# Altium footprint library OXI_ONE.PcbLib: 74 footprints (part 2 of 5)
Each footprint in its own frame and in the unit in brackets; x right, y up, seen from the top. Pads: shape width x height; smd on the part's side, far side on the other; paste and mask are expansions set on the pad; w line width, h text height; cw(c..) or ccw(c..) is an arc to the next point about the centre after c.
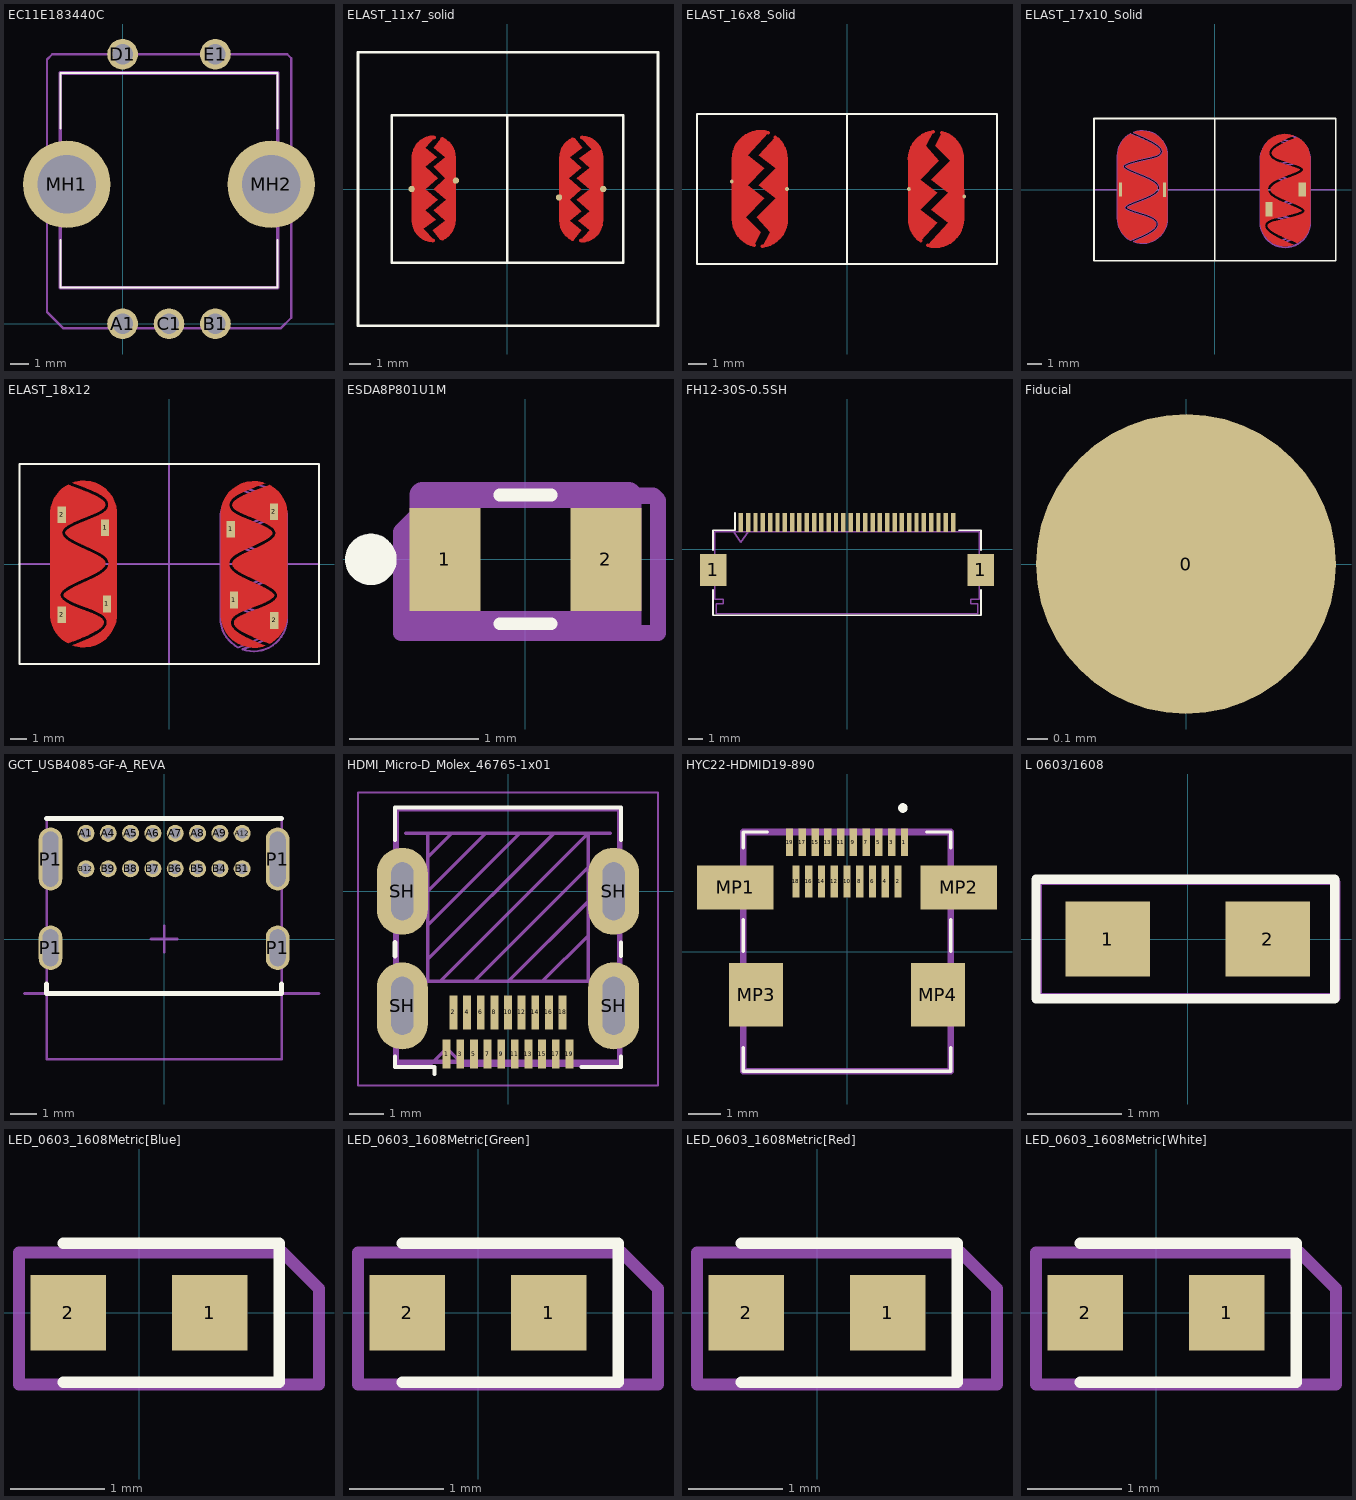
[diagram p1: the footprints below, top view; thin cyan lines are the x and y axes]

## EC11E183440C [mm]
pads (7):
  round 1.65 hole 1.1: A1(0,0) B1(5,0) C1(2.5,0) D1(0,14.5) E1(5,14.5)
  round 4.708 hole 3.139: MH1(-3,7.5) MH2(8,7.5)
Top Overlay:
  lines w0.1: -3.35,4.5 -3.35,1.94 8.35,1.94 8.35,4.5 ; -3.35,10.5 -3.35,13.5 8.35,13.5 8.35,10.5
Mechanical 13:
  lines w0.2: -3.35,1.94 8.35,1.94 8.35,13.5 -3.35,13.5 -3.35,1.94
Top Assembly (Mech29):
  lines w0.127: -4.064,0.635 -4.064,14.224 -3.788,14.5 8.868,14.5 9.079,14.289 9.079,0.316 8.509,-0.254 -3.175,-0.254 -4.064,0.635
  text ".Designator" at 0.254,7.112 h1
3D body "EC11E-15SW.STEP": height 24.6, standoff -3.4, extent -4.049,-0.275 9.049,14.675

## ELAST_11x7_solid [mm]
pads (4):
  round 0.3 smd paste-0.3 mask+0.051: 1(-4.55,0) 1(4.55,0) 2(-2.45,0.4) 2(2.45,-0.4)
Top Layer:
  region: 3.55,1.95 2.95,1.5 3.5,1 2.9,0.5 3.5,0 2.95,-0.5 3.5,-1.05 2.95,-1.5 3.5,-1.95 3.15,-2.4 2.8,-2.2 2.5,-1.5 2.6,1.8 3.1,2.4 3.2,2.4
  region: 3.9,2.4 4.4,1.8 4.5,-1.6 4,-2.3 3.45,-2.45 3.9,-1.95 3.35,-1.5 3.9,-1.05 3.3,-0.5 3.9,0 3.3,0.5 3.9,1 3.4,1.45 4,1.9 3.45,2.45
  region: -2.8,2.2 -2.5,1.5 -2.6,-1.8 -3.1,-2.4 -3.2,-2.4 -3.55,-1.95 -2.95,-1.5 -3.5,-1 -2.9,-0.5 -3.5,0 -2.95,0.5 -3.5,1.05 -2.95,1.5 -3.5,1.95 -3.15,2.4
  region: -3.9,1.95 -3.35,1.5 -3.9,1.05 -3.3,0.5 -3.9,0 -3.3,-0.5 -3.9,-1 -3.4,-1.45 -4,-1.9 -3.45,-2.45 -3.9,-2.4 -4.4,-1.8 -4.5,1.6 -4,2.3 -3.45,2.45
  lines w0.2: -4.45,1.5 -4.45,-1.5 ccw(c-3.5,-1.5) -3.551,-2.449 ; -4.448,1.555 cw(c-3.5,1.5) -3.5,2.45 ; -3.1,-2.35 ccw(c-3.5,-1.5) -2.561,-1.502 ; -3.094,2.359 cw(c-3.5,1.5) -2.55,1.5 -2.55,-1.5 ; 2.55,1.5 2.55,-1.5 ccw(c3.5,-1.5) 3.094,-2.359 ; 2.561,1.502 cw(c3.5,1.5) 3.1,2.35 ; 3.5,-2.45 ccw(c3.5,-1.5) 4.448,-1.555 ; 3.551,2.449 cw(c3.5,1.5) 4.45,1.5 4.45,-1.5
Top Overlay:
  lines w0.12: 0,-3.5 0,0 0,3.5 ; -7.1,-6.5 -7.1,6.5 7.15,6.5 7.15,-6.5 -7.1,-6.5 ; -5.5,-3.5 5.5,-3.5 5.5,3.5 -5.5,3.5 -5.5,-3.5
Top Solder:
  region: -2.5,-1.5 -4.5,-1.5 -4.5,1.5 -2.5,1.5
  region: 4.5,-1.5 2.5,-1.5 2.5,1.5 4.5,1.5
  region: 3.55,1.95 2.95,1.5 3.5,1 2.9,0.5 3.5,0 2.95,-0.5 3.5,-1.05 2.95,-1.5 3.5,-1.95 3.15,-2.4 2.8,-2.2 2.5,-1.5 2.6,1.8 3.1,2.4 3.2,2.4
  region: 3.9,2.4 4.4,1.8 4.5,-1.6 4,-2.3 3.45,-2.45 3.9,-1.95 3.35,-1.5 3.9,-1.05 3.3,-0.5 3.9,0 3.3,0.5 3.9,1 3.4,1.45 4,1.9 3.45,2.45
  region: -2.8,2.2 -2.5,1.5 -2.6,-1.8 -3.1,-2.4 -3.2,-2.4 -3.55,-1.95 -2.95,-1.5 -3.5,-1 -2.9,-0.5 -3.5,0 -2.95,0.5 -3.5,1.05 -2.95,1.5 -3.5,1.95 -3.15,2.4
  region: -3.9,1.95 -3.35,1.5 -3.9,1.05 -3.3,0.5 -3.9,0 -3.3,-0.5 -3.9,-1 -3.4,-1.45 -4,-1.9 -3.45,-2.45 -3.9,-2.4 -4.4,-1.8 -4.5,1.6 -4,2.3 -3.45,2.45
  lines w0.2: -4.45,1.5 -4.45,-1.5 ccw(c-3.5,-1.5) -3.551,-2.449 ; -4.448,1.555 cw(c-3.5,1.5) -3.5,2.45 ; -3.1,-2.35 ccw(c-3.5,-1.5) -2.561,-1.502 ; -3.094,2.359 cw(c-3.5,1.5) -2.55,1.5 -2.55,-1.5 ; 2.55,1.5 2.55,-1.5 ccw(c3.5,-1.5) 3.094,-2.359 ; 2.561,1.502 cw(c3.5,1.5) 3.1,2.35 ; 3.5,-2.45 ccw(c3.5,-1.5) 4.448,-1.555 ; 3.551,2.449 cw(c3.5,1.5) 4.45,1.5 4.45,-1.5

## ELAST_16x8_Solid [mm]
pads (4):
  round 0.2 smd paste-0.2 mask+0.051: 1(-3.2,0) 1(3.3,0) 2(-6.15,0.4) 2(6.25,-0.4)
Top Layer:
  region: 4.2,2.3 4.9,1.5 3.9,0.5 4.8,-0.2 3.9,-1.1 4.8,-1.8 3.93,-2.76 3.6,-2.4 3.35,-1.6 3.347,1.601 3.6,2.3 3.9,2.7 4.6,3.05
  region: 5.6,2.7 6,2.2 6.1,1.7 6.1,-1.7 6,-2.2 5.7,-2.6 5,-3 4.3,-3 5.4,-1.8 4.5,-1.1 5.4,-0.2 4.5,0.5 5.5,1.5 4.7,2.3 5.053,3.006
  region: -3.5,2.4 -3.25,1.6 -3.247,-1.601 -3.5,-2.3 -3.8,-2.7 -4.5,-3.05 -4.1,-2.3 -4.8,-1.5 -3.8,-0.5 -4.7,0.2 -3.8,1.1 -4.7,1.8 -3.83,2.76
  region: -5.3,1.8 -4.4,1.1 -5.3,0.2 -4.4,-0.5 -5.4,-1.5 -4.6,-2.3 -4.953,-3.006 -5.5,-2.7 -5.9,-2.2 -6,-1.7 -6,1.7 -5.9,2.2 -5.6,2.6 -4.9,3 -4.2,3
  lines w0.2: -6.056,1.6 -6.05,-1.6 ccw(c-4.6,-1.6) -4.953,-3.006 ; -6.056,1.604 cw(c-4.6,1.6) -4.2,3 ; -4.5,-3.05 ccw(c-4.7,-1.6) -3.236,-1.601 ; -3.829,2.76 cw(c-4.7,1.6) -3.25,1.6 -3.244,-1.6 ; 3.336,1.601 cw(c4.8,1.6) 4.6,3.05 ; 3.344,1.6 3.35,-1.6 ccw(c4.8,-1.6) 3.929,-2.76 ; 4.3,-3 ccw(c4.7,-1.6) 6.156,-1.604 ; 5.053,3.006 cw(c4.7,1.6) 6.15,1.6 6.156,-1.6
Top Overlay:
  lines w0.12: -7.5,4 0,4 0,0 0,-4 ; -8,-4 -8,4 8,4 8,-4 -8,-4
Top Solder:
  circle w3: c-4.7,1.6 r0.112
  circle w3: c-4.7,-1.6 r0.112
  circle w3: c4.7,1.6 r0.112
  circle w3: c4.7,-1.6 r0.112
  region: -3.2,-1.6 -6.2,-1.6 -6.2,1.6 -3.2,1.6
  region: 6.2,-1.6 3.2,-1.6 3.2,1.6 6.2,1.6
  region: 4.2,2.3 4.9,1.5 3.9,0.5 4.8,-0.2 3.9,-1.1 4.8,-1.8 3.93,-2.76 3.6,-2.4 3.35,-1.6 3.347,1.601 3.6,2.3 3.9,2.7 4.6,3.05
  region: 5.6,2.7 6,2.2 6.1,1.7 6.1,-1.7 6,-2.2 5.7,-2.6 5,-3 4.3,-3 5.4,-1.8 4.5,-1.1 5.4,-0.2 4.5,0.5 5.5,1.5 4.7,2.3 5.053,3.006
  region: -3.5,2.4 -3.25,1.6 -3.247,-1.601 -3.5,-2.3 -3.8,-2.7 -4.5,-3.05 -4.1,-2.3 -4.8,-1.5 -3.8,-0.5 -4.7,0.2 -3.8,1.1 -4.7,1.8 -3.83,2.76
  region: -5.3,1.8 -4.4,1.1 -5.3,0.2 -4.4,-0.5 -5.4,-1.5 -4.6,-2.3 -4.953,-3.006 -5.5,-2.7 -5.9,-2.2 -6,-1.7 -6,1.7 -5.9,2.2 -5.6,2.6 -4.9,3 -4.2,3
  lines w0.2: -6.056,1.6 -6.05,-1.6 ccw(c-4.6,-1.6) -4.953,-3.006 ; -6.056,1.604 cw(c-4.6,1.6) -4.2,3 ; -4.5,-3.05 ccw(c-4.7,-1.6) -3.236,-1.601 ; -3.829,2.76 cw(c-4.7,1.6) -3.25,1.6 -3.244,-1.6 ; 3.336,1.601 cw(c4.8,1.6) 4.6,3.05 ; 3.344,1.6 3.35,-1.6 ccw(c4.8,-1.6) 3.929,-2.76 ; 4.3,-3 ccw(c4.7,-1.6) 6.156,-1.604 ; 5.053,3.006 cw(c4.7,1.6) 6.15,1.6 6.156,-1.6

## ELAST_17x10_Solid [mm]
pads (4):
  rect 0.2x1 smd paste-1 mask+0.102: 1(-3.543,-0.013) 2(-6.642,0)
  rect 0.5x1 smd paste-1: 1(3.812,-1.379) 2(6.147,0)
Top Layer:
  drawing of 4 lines, arcs and shapes, not listed
Top Overlay:
  lines w0.12: 0,-5 0,5 ; -8.5,-5 8.5,-5 8.5,5 -8.5,5 -8.5,-5
Mechanical 1:
  drawing of 10936 lines, arcs and shapes, not listed
Top Designator:
  lines w0.12: -8.5,0 8.525,0

## ELAST_18x12 [mm]
pads (8):
  rect 0.5x1 smd paste-1: 1(-3.848,2.184) 1(-3.734,-2.4) 1(3.708,2.083) 1(3.894,-2.164) 2(-6.452,-3.048) 2(-6.452,2.952) 2(6.293,3.134) 2(6.319,-3.391)
Top Layer:
  drawing of 4 lines, arcs and shapes, not listed
Top Overlay:
  lines w0.12: 0,6 -9,6 ; -9,6 -9,-6 9,-6 9,6 -9,6
Mechanical 1:
  drawing of 6633 lines, arcs and shapes, not listed
Mechanical 2:
  lines w0.12: -9.017,0 0,0 9,0 ; 0,-6 0,6

## ESDA8P801U1M [mm]
pads (2):
  rect 0.55x0.8 smd: 1(-0.625,0) 2(0.625,0)
Top Overlay:
  lines w0.1: -0.2,-0.5 0.2,-0.5 ; -0.2,0.5 0.2,0.5
  lines w0.2: -1.2,-0.1 cw(c-1.2,0) -1.2,0.1 cw(c-1.2,0) -1.2,-0.1
Mechanical 13:
  lines w0.2: -0.8,-0.5 -0.8,0.5 0.8,0.5 0.8,-0.5 -0.8,-0.5
Top Assembly (Mech29):
  lines w0.127: -0.965,-0.572 1.029,-0.572 1.029,0.457 0.991,0.495 -0.686,0.495 -0.965,0.216 -0.965,-0.572
  text ".Designator" at -0.838,-0.419 h1

## FH12-30S-0.5SH [mm]
pads (32):
  rect 1.8x2.2 smd mask+0.051: 1(-9.15,-1.4) 1(9.15,-1.4)
  rect 0.3x1.3 smd mask+0.051: 1(-7.25,1.85) 2(-6.75,1.85) 3(-6.25,1.85) 4(-5.75,1.85) 5(-5.25,1.85) 6(-4.75,1.85) 7(-4.25,1.85) 8(-3.75,1.85) 9(-3.25,1.85) 10(-2.75,1.85) 11(-2.25,1.85) 12(-1.75,1.85) 13(-1.25,1.85) 14(-0.75,1.85) 15(-0.25,1.85) 16(0.25,1.85) 17(0.75,1.85) 18(1.25,1.85) 19(1.75,1.85) 20(2.25,1.85) 21(2.75,1.85) 22(3.25,1.85) 23(3.75,1.85) 24(4.25,1.85) 25(4.75,1.85) 26(5.25,1.85) 27(5.75,1.85) 28(6.25,1.85) 29(6.75,1.85) 30(7.25,1.85)
Top Overlay:
  lines w0.12: -9.15,-2.76 -9.15,-4.5 9.15,-4.5 9.15,-2.76 ; -9.15,-0.04 -9.15,1.3 -7.66,1.3 -7.66,2.5 ; 7.66,1.3 9.15,1.3 9.15,-0.04
Top Assembly (Mech29):
  lines w0.1: -7.75,1.2 -7.25,0.493 -6.75,1.2 ; -9.05,-3.4 -9.05,1.2 0,1.2 9.05,1.2 9.05,-3.4 8.45,-3.4 8.45,-3.7 8.95,-3.7 8.95,-4.4 0,-4.4 -8.95,-4.4 -8.95,-3.7 -8.45,-3.7 -8.45,-3.4 -9.05,-3.4
  text ".Designator" at -1.143,-1.905 h1
3D body "FH12-30S-0.5SH.stp": height 2.14, standoff 0.04, extent -9.55,-4.368 9.55,2.032

## Fiducial [mm]
pads (1):
  round 1.5 smd paste-1 mask+3: 0(0,0)

## GCT_USB4085-GF-A_REVA [mm] "USB 2.0 Type C Receptacle Dip Type, PCB Top Mount"
height 3.46
pads (20):
  round 0.65 hole 0.4: A1(-2.975,4.025) A4(-2.125,4.025) A5(-1.275,4.025) A6(-0.425,4.025) A7(0.425,4.025) A8(1.275,4.025) A9(2.125,4.025) A12(2.975,4.025) B1(2.975,2.675) B4(2.125,2.675) B5(1.275,2.675) B6(0.425,2.675) B7(-0.425,2.675) B8(-1.275,2.675) B9(-2.125,2.675) B12(-2.975,2.675)
  oval 0.9x1.7 hole 0.6 slot 1.4 at 90 deg: P1(-4.325,-0.335) P1(4.325,-0.335)
  oval 0.9x2.4 hole 0.6 slot 2.1 at 90 deg: P1(-4.325,3.045) P1(4.325,3.045)
Top Overlay:
  lines w0.2: -4.475,-1.725 -4.475,-2.075 4.475,-2.075 4.475,-1.725 ; -4.475,4.585 4.475,4.585
Mechanical 15:
  lines w0.1: -0.5,0 0.5,0 ; 0,-0.5 0,0.5
Mechanical 16:
  lines w0.127: -5.3,-2.075 5.9,-2.075
  text ">PCB Edge" at 5.7,-2.075 h1.57
Top Assembly (Mech29):
  lines w0.1: -4.475,-4.585 -4.475,4.585 4.475,4.585 4.475,-4.585 -4.475,-4.585
  text ".Designator" at -2.159,-0.508 h1
3D body "USB4085-03-A_revA.STEP": height 3.46, standoff -2.1, extent -4.515,-4.564 4.515,4.606

## HDMI_Micro-D_Molex_46765-1x01 [mm]
pads (23):
  rect 0.23x0.85 smd mask+0.051: 1(-1.8,-4.775) 3(-1.4,-4.775) 5(-1,-4.775) 7(-0.6,-4.775) 9(-0.2,-4.775) 11(0.2,-4.775) 13(0.6,-4.775) 15(1,-4.775) 17(1.4,-4.775) 19(1.8,-4.775)
  rect 0.23x1 smd mask+0.051: 2(-1.6,-3.55) 4(-1.2,-3.55) 6(-0.8,-3.55) 8(-0.4,-3.55) 10(0,-3.55) 12(0.4,-3.55) 14(0.8,-3.55) 16(1.2,-3.55) 18(1.6,-3.55)
  rrect100% 1.5x2.55 hole 1.7 slot 0.65 at 0 deg paste-2.55 mask+0.051: SH(-3.1,-3.36) SH(-3.1,0) SH(3.1,-3.36) SH(3.1,0)
Top Overlay:
  lines w0.12: -3.31,-4.85 -3.31,-5.16 -2.15,-5.16 -2.15,-5.36 ; -3.31,1.5 -3.31,2.46 3.31,2.46 3.31,1.5 ; 2.15,-5.16 3.31,-5.16 3.31,-4.85 ; 3.31,-1.9 3.31,-1.5
  lines w0.15: -3.31,-1.9 -3.31,-1.5
Mechanical 2:
  lines w0.1: -3,1.7 3,1.7 ; -2.35,-2 1.35,1.7 ; -2.35,-1 0.35,1.7 ; -2.35,0 -0.65,1.7 ; -2.35,1 -1.65,1.7 ; -2.35,1.7 -2.35,-2.64 2.35,-2.64 2.35,1.7 -1.99,-2.64 ; -0.99,-2.64 2.35,0.7 ; 0.01,-2.64 2.35,-0.3 ; 1.01,-2.64 2.35,-1.3
Top Assembly:
  lines w0.05: -4.4,-5.7 4.4,-5.7 4.4,2.9 -4.4,2.9 -4.4,-5.7
Bottom Assembly:
  lines w0.1: -1.8,-4.6 -2.3,-5.1 -3.25,-5.1 -3.25,2.4 3.25,2.4 3.25,-5.1 -1.3,-5.1
  text "J3" at -0.85,-3.95 h1
Mechanical 6:
  lines w0.1: -1.8,-4.6 -1.3,-5.1
Mechanical 7:
  text "KEEPOUT" at 2.185,-0.92 h0.7
Top Assembly (Mech29):
  lines w0.127: -3.31,-5.005 3.31,-5.005 3.297,-4.992 3.297,2.408 -3.31,2.408 -3.31,-5.005
  text ".Designator" at -2.476,-0.292 h1

## HYC22-HDMID19-890 [mm]
pads (23):
  rect 0.23x0.85 smd: 1(1.8,3.425) 3(1.4,3.425) 5(1,3.425) 7(0.6,3.425) 9(0.2,3.425) 11(-0.2,3.425) 13(-0.6,3.425) 15(-1,3.425) 17(-1.4,3.425) 19(-1.8,3.425)
  rect 0.23x1 smd: 2(1.6,2.2) 4(1.2,2.2) 6(0.8,2.2) 8(0.4,2.2) 10(0,2.2) 12(-0.4,2.2) 14(-0.8,2.2) 16(-1.2,2.2) 18(-1.6,2.2)
  rect 2.4x1.38 smd: MP1(-3.5,2.01) MP2(3.5,2.01)
  rect 1.7x2 smd: MP3(-2.85,-1.35) MP4(2.85,-1.35)
Top Overlay:
  lines w0.1: -3.25,-3.75 3.25,-3.75 ; -3.25,-3.75 3.25,-3.75 ; -3.25,-3.75 -3.25,-3 -3.25,-3.75 ; -3.25,3.75 -3.25,3.25 -3.25,3.75 ; -3.25,3.75 -2.5,3.75 -3.25,3.75 ; 3.25,-3.75 3.25,-3 3.25,-3.75 ; 3.25,3.75 2.5,3.75 3.25,3.75 ; 3.25,3.75 3.25,3.25 3.25,3.75 ; -3.25,0 -3.25,1 -3.25,0 ; 3.25,0 3.25,1 3.25,0
  lines w0.2: 1.7,4.5 ccw(c1.75,4.5) 1.8,4.5 ; 1.7,4.5 cw(c1.75,4.5) 1.8,4.5 ; 1.7,4.5 ccw(c1.75,4.5) 1.8,4.5
Mechanical 13:
  lines w0.2: -3.25,-3.75 3.25,-3.75 3.25,3.75 -3.25,3.75 -3.25,-3.75
Top Assembly (Mech29):
  lines w0.127: -3.251,-3.759 3.213,-3.759 3.213,3.708 -3.251,3.708 -3.251,-3.759
  text ".Designator" at -2.184,-0.318 h1

## L 0603/1608 [mm]
pads (2):
  rect 0.9x0.8 smd: 1(-0.85,0) 2(0.85,0)
Top Overlay:
  lines w0.1: -1.612,-0.635 1.563,-0.635 1.563,0.635 -1.612,0.635 -1.612,-0.635
Top Assembly (Mech29):
  lines w0.1: -1.6,-0.625 1.575,-0.625 1.575,0.6 1.55,0.625 -1.6,0.625 -1.6,-0.625
  text ".Designator" at -1.4,-0.4 h0.8
3D body: height 0.64, standoff 0, extent 0.85,-0.4 1.3,0.4
3D body: height 0.64, standoff 0, extent -1.3,-0.4 -0.85,0.4
3D body: height 0.64, standoff 0, extent -0.85,-0.4 0.85,0.4

## LED_0603_1608Metric[Blue] [mm]
pads (2):
  rect 0.8x0.8 smd mask+0.051: 1(0.75,0) 2(-0.75,0)
Top Overlay:
  lines w0.12: -0.8,-0.735 1.485,-0.735 1.485,0.735 -0.8,0.735
Top Assembly (Mech29):
  lines w0.127: -1.27,-0.762 -1.27,0.635 0.889,0.635 1.524,0.635 1.905,0.254 1.905,-0.762 -1.27,-0.762
  text ".Designator" at -1.016,-0.762 h1
  text "K" at 1.016,0.762 h1
3D body "User Library-LED_0603_B.STEP": height 0.6, standoff 0, extent -0.8,-0.4 0.8,0.4

## LED_0603_1608Metric[Green] [mm]
pads (2):
  rect 0.8x0.8 smd mask+0.051: 1(0.75,0) 2(-0.75,0)
Top Overlay:
  lines w0.12: -0.8,-0.735 1.485,-0.735 1.485,0.735 -0.8,0.735
Top Assembly (Mech29):
  lines w0.127: -1.27,-0.762 1.905,-0.762 1.905,0.254 1.524,0.635 0.889,0.635 -1.27,0.635 -1.27,-0.762
  text "K" at 1.016,0.762 h1
  text ".Designator" at -1.016,-0.762 h1
3D body "User Library-LED_0603_G.STEP": height 0.6, standoff 0, extent -0.8,-0.4 0.8,0.4

## LED_0603_1608Metric[Red] [mm]
pads (2):
  rect 0.8x0.8 smd mask+0.051: 1(0.75,0) 2(-0.75,0)
Top Overlay:
  lines w0.12: -0.8,-0.735 1.485,-0.735 1.485,0.735 -0.8,0.735
Top Assembly (Mech29):
  lines w0.127: -1.27,-0.762 1.905,-0.762 1.905,0.254 1.524,0.635 0.889,0.635 -1.27,0.635 -1.27,-0.762
  text "K" at 1.016,0.762 h1
  text ".Designator" at -1.016,-0.762 h1
3D body "red.step": height 0.6, standoff 0, extent -0.81,-0.4 0.81,0.4

## LED_0603_1608Metric[White] [mm]
pads (2):
  rect 0.8x0.8 smd mask+0.051: 1(0.75,0) 2(-0.75,0)
Top Overlay:
  lines w0.12: -0.8,-0.735 1.485,-0.735 1.485,0.735 -0.8,0.735
Top Assembly (Mech29):
  lines w0.127: -1.27,-0.762 1.905,-0.762 1.905,0.254 1.524,0.635 0.889,0.635 -1.27,0.635 -1.27,-0.762
  text "K" at 1.016,0.762 h1
  text ".Designator" at -1.016,-0.762 h1
3D body "User Library-LED SMD0603.step": height 0.68, standoff 0, extent -0.825,-0.344 0.825,0.381